# Altium footprint library Dr.Xiong_20160818.PcbLib: 266 footprints (part 16 of 17)
Each footprint in its own frame and in the unit in brackets; x right, y up, seen from the top. Pads: shape width x height; smd on the part's side, far side on the other; paste and mask are expansions set on the pad; w line width, h text height; cw(c..) or ccw(c..) is an arc to the next point about the centre after c.
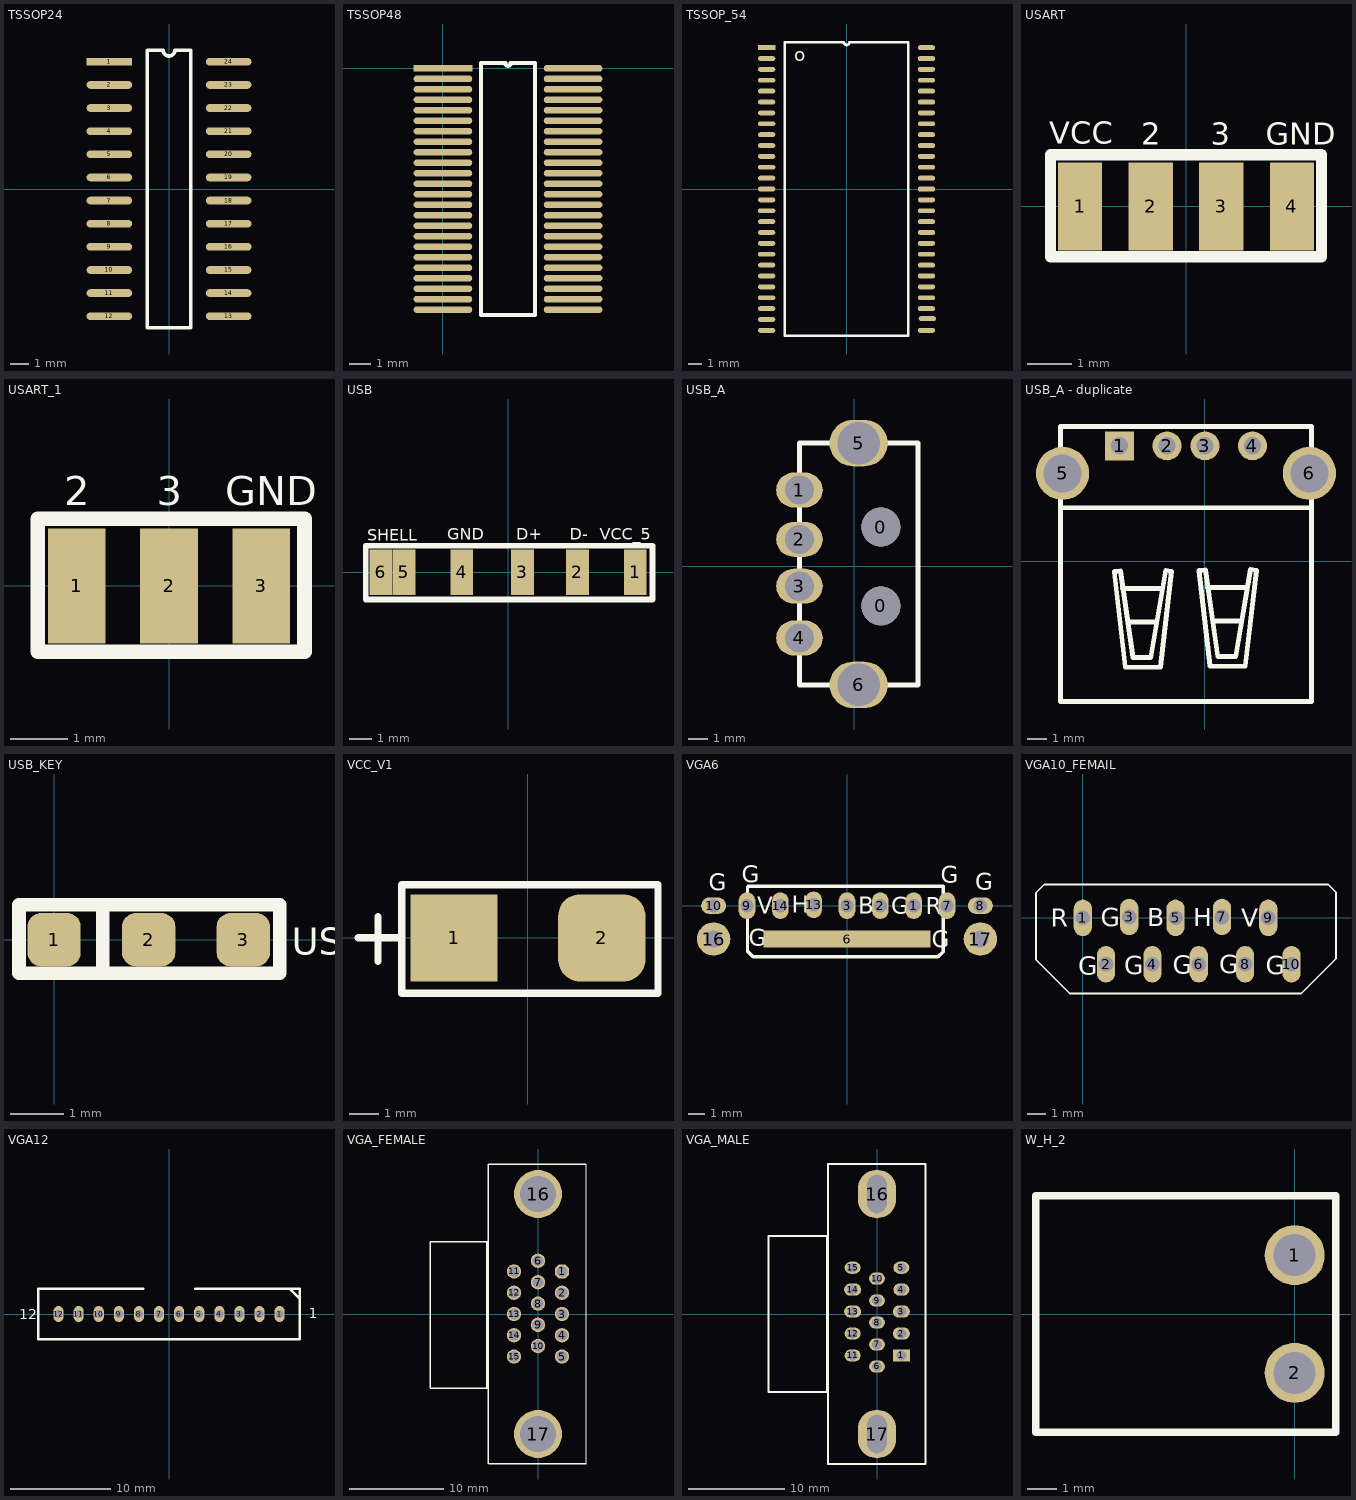
[diagram p15: the footprints below, top view; thin cyan lines are the x and y axes]

## TSSOP24 [mm]
pads (24):
  rect 2.5x0.43 smd: 1(-3.275,6.985)
  oval 2.5x0.43 smd: 2(-3.275,5.715) 3(-3.275,4.445) 4(-3.275,3.175) 5(-3.275,1.905) 6(-3.275,0.635) 7(-3.275,-0.635) 8(-3.275,-1.905) 9(-3.275,-3.175) 10(-3.275,-4.445) 11(-3.275,-5.715) 12(-3.275,-6.985) 13(3.275,-6.985) 14(3.275,-5.715) 15(3.275,-4.445) 16(3.275,-3.175) 17(3.275,-1.905) 18(3.275,-0.635) 19(3.275,0.635) 20(3.275,1.905) 21(3.275,3.175) 22(3.275,4.445) 23(3.275,5.715) 24(3.275,6.985)
Top Overlay:
  lines w0.2: -1.19,-7.62 1.19,-7.62 1.19,7.62 0.318,7.62 cw(c0,7.62) -0.318,7.62 -1.19,7.62 -1.19,-7.62

## TSSOP48 [mm]
pads (48):
  rect 2.794x0.32 smd: 1(0,0)
  oval 2.794x0.32 smd: 2(0,-0.5) 3(0,-1) 4(0,-1.5) 5(0,-2) 6(0,-2.5) 7(0,-3) 8(0,-3.5) 9(0,-4) 10(0,-4.5) 11(0,-5) 12(0,-5.5) 13(0,-6) 14(0,-6.5) 15(0,-7) 16(0,-7.5) 17(0,-8) 18(0,-8.5) 19(0,-9) 20(0,-9.5) 21(0,-10) 22(0,-10.5) 23(0,-11) 24(0,-11.5) 25(6.2,-11.5) 26(6.2,-11) 27(6.2,-10.5) 28(6.2,-10) 29(6.2,-9.5) 30(6.2,-9) 31(6.2,-8.5) 32(6.2,-8) 33(6.2,-7.5) 34(6.2,-7) 35(6.2,-6.5) 36(6.2,-6) 37(6.2,-5.5) 38(6.2,-5) 39(6.2,-4.5) 40(6.2,-4) 41(6.2,-3.5) 42(6.2,-3) 43(6.2,-2.5) 44(6.2,-2) 45(6.2,-1.5) 46(6.2,-1) 47(6.2,-0.5) 48(6.2,0)
Top Overlay:
  lines w0.2: 1.81,-11.75 1.81,0.25 2.975,0.25 ccw(c3.1,0.25) 3.225,0.25 4.39,0.25 4.39,-11.75 1.81,-11.75

## TSSOP_54 [mil]
pads (54):
  rect 50x14 smd: 1(-232.75,409.45)
  oval 50x14 smd: 2(-232.75,377.95) 3(-232.75,346.46) 4(-232.75,314.96) 5(-232.75,283.46) 6(-232.75,251.97) 7(-232.75,220.47) 8(-232.75,188.98) 9(-232.75,157.48) 10(-232.75,125.98) 11(-232.75,94.49) 12(-232.75,62.99) 13(-232.75,31.5) 14(-232.75,0) 15(-232.75,-31.5) 16(-232.75,-62.99) 17(-232.75,-94.49) 18(-232.75,-125.98) 19(-232.75,-157.48) 20(-232.75,-188.98) 21(-232.75,-220.47) 22(-232.75,-251.97) 23(-232.75,-283.46) 24(-232.75,-314.96) 25(-232.75,-346.46) 26(-232.75,-377.95) 27(-232.75,-409.45) 28(230.24,-409.45) 29(232.75,-375.44) 30(230.24,-346.46) 31(230.24,-314.96) 32(230.24,-283.46) 33(230.24,-251.97) 34(230.24,-220.47) 35(230.24,-188.98) 36(230.24,-157.48) 37(230.24,-125.98) 38(230.24,-94.49) 39(230.24,-62.99) 40(230.24,-31.5) 41(230.24,0) 42(230.24,31.5) 43(230.24,62.99) 44(230.24,94.49) 45(230.24,125.98) 46(230.24,157.48) 47(230.24,188.98) 48(230.24,220.47) 49(230.24,251.97) 50(230.24,283.46) 51(230.24,314.96) 52(230.24,346.46) 53(230.24,377.95) 54(230.24,409.45)
Top Overlay:
  lines w7.87: -180.19,-425.2 -180.19,425.2 -9.13,425.2 ccw(c-1.26,425.2) 6.62,425.2 177.68,425.2 177.68,-425.2 -180.19,-425.2
  text "o" at -152.75,369.45 h39.37

## USART [mm]
pads (4):
  rect 1x2 smd: 1(-2.4,0) 2(-0.8,0) 3(0.8,0) 4(2.4,0)
Top Overlay:
  lines w0.254: -3.073,-1.143 3.073,-1.143 3.073,1.168 -3.073,1.168 -3.073,-1.143
  text "GND" at 1.803,1.397 h0.51
  text "3" at 0.559,1.397 h0.51
  text "2" at -1.016,1.397 h0.51
  text "VCC" at -3.099,1.422 h0.51

## USART_1 [mm]
pads (3):
  rect 1x2 smd: 1(-1.6,0) 2(0,0) 3(1.6,0)
Top Overlay:
  lines w0.254: -2.273,-1.143 2.349,-1.143 2.349,1.168 -2.273,1.168 -2.273,-1.143
  text "GND" at 0.978,1.397 h0.51
  text "3" at -0.216,1.397 h0.51
  text "2" at -1.816,1.397 h0.51

## USB [mm]
pads (6):
  rect 1x2 smd: 1(5.588,0) 2(3.048,0) 3(0.635,0) 4(-2.032,0) 5(-4.572,0) 6(-5.588,0)
Top Overlay:
  lines w0.254: -6.248,-1.194 6.35,-1.194 6.35,1.168 -6.248,1.168 -6.248,-1.194
  text "D+" at 0.356,1.422 h0.51
  text "D-" at 2.718,1.422 h0.51
  text "VCC_5" at 4.039,1.422 h0.51
  text "GND" at -2.667,1.422 h0.51
  text "SHELL" at -6.172,1.397 h0.51

## USB_A [mm]
pads (8):
  round 2 hole 2: 0(1.372,-2.032) 0(1.372,2.032)
  oval 2.4x1.8 hole 1.5: 1(-2.819,3.937) 2(-2.819,1.397) 3(-2.819,-1.016) 4(-2.819,-3.683)
  oval 3x2.4 hole 2.2: 5(0.229,6.35) 6(0.229,-6.096)
Top Overlay:
  lines w0.254: -2.819,-6.096 3.277,-6.096 3.277,6.35 -2.819,6.35 -2.819,-6.096

## USB_A - duplicate [mil]
pads (6):
  rect 60x60 hole 36: 1(-176.77,239)
  round 60 hole 36: 2(-78.35,239) 3(0.39,239) 4(98.82,239)
  round 110.24 hole 78.74: 5(-294.88,181.91) 6(216.93,181.91)
Top Overlay:
  lines w10: -298.98,110.45 221.02,110.45 ; -170.98,-57 -88.98,-57 ; -157.98,-126 -100.98,-126 ; 5.02,-55 87.02,-55 ; 18.02,-124 75.02,-124 ; -298.98,-291 -298.98,279 221.02,279 221.02,-291 -298.98,-291 ; -187.88,-21.3 -164.98,-220 -91.98,-220 -68.98,-21 -80.98,-19 -111.98,-200 -148.98,-200 -174.78,-20.3 -187.88,-21.3 ; -11.88,-19.3 1.22,-18.3 27.02,-198 64.02,-198 95.02,-17 107.02,-19 84.02,-218 11.02,-218 -11.88,-19.3
Mechanical 15:
  lines w0.1: -2.48,-2 -0.48,0

## USB_KEY [mm]
pads (3):
  rrect50% 1x1 smd: 1(0,0) 2(1.778,0) 3(3.556,0)
Top Overlay:
  lines w0.254: -0.66,-0.635 2.311,-0.635 ; -0.66,-0.584 -0.66,0.66 2.337,0.66 4.242,0.66 4.242,-0.635 2.286,-0.635 ; 0.914,-0.559 0.914,0.635
  text "USB" at 4.47,-0.279 h0.51

## VCC_V1 [mm]
pads (2):
  rect 3x3 smd: 1(-2.54,0)
  rrect50% 3x3 smd: 2(2.54,0)
Top Overlay:
  lines w0.254: -5.842,0 -4.343,0 ; -5.156,-0.813 -5.156,0.737 ; -4.343,-1.905 -4.343,1.829 4.47,1.829 4.47,-1.905 -4.343,-1.905

## VGA6 [mm]
pads (12):
  oval 1x1.6 hole 0.8: 1(4,0) 2(2,0) 3(0,0) 7(6,0) 9(-6,0) 13(-2,0.051) 14(-4,0)
  rect 10x1 smd: 6(0,-2)
  oval 1.5x1 hole 0.8: 8(8,0) 10(-8,0)
  round 2 hole 1: 16(-8,-2) 17(8,-2)
Top Overlay:
  lines w0.203: -5.969,-2.743 -5.969,1.118 -5.918,1.168 5.766,1.168 5.766,-2.769 5.461,-3.073 -5.639,-3.073 -5.969,-2.743
  text "G" at -8.28,0.889 h1
  text "G" at 5.08,-2.515 h1
  text "V" at -5.385,-0.483 h1
  text "H" at -3.327,-0.432 h1
  text "B" at 0.66,-0.483 h1
  text "G" at 2.667,-0.508 h1
  text "R" at 4.724,-0.508 h1
  text "G" at -6.325,1.372 h1
  text "G" at 5.639,1.346 h1
  text "G" at 7.696,0.94 h1
  text "G" at -5.893,-2.438 h1

## VGA10_FEMAIL [mm]
pads (10):
  oval 1x2 hole 0.8: 1(0,0) 2(1.27,-2.54) 3(2.54,0.051) 4(3.81,-2.54) 5(5.08,0) 6(6.35,-2.54) 7(7.62,0.051) 8(8.89,-2.54) 9(10.16,0) 10(11.43,-2.54)
Top Overlay:
  lines w0.102: -1.981,1.829 13.437,1.829 13.868,1.397 13.868,-2.235 11.963,-4.14 -0.711,-4.14 -2.565,-2.286 -2.565,1.372 -2.108,1.829 -1.93,1.829
  text "G" at 2.261,-3.073 h1
  text "G" at 4.928,-3.048 h1
  text "G" at 7.468,-3.023 h1
  text "G" at 10.008,-3.073 h1
  text "G" at -0.254,-3.124 h1
  text "V" at 8.687,-0.483 h1
  text "H" at 6.045,-0.457 h1
  text "B" at 3.531,-0.457 h1
  text "G" at 0.991,-0.457 h1
  text "R" at -1.753,-0.483 h1

## VGA12 [mm]
pads (12):
  oval 1x1.6 hole 0.8: 1(11,0) 2(9,0) 3(7,0) 4(5,0) 5(3,0) 6(1,0) 7(-1,0) 8(-3,0) 9(-5,0) 10(-7,0) 11(-9,0) 12(-11,0)
Top Overlay:
  lines w0.254: -13,-2.5 13,-2.5 ; -13,-2.434 -13,2.5 -2.555,2.5 ; 2.602,2.5 13,2.5 13,-2.479 ; 11.887,2.5 11.978,2.5 ; 12.014,2.5 12.049,2.5 13,1.549
  text "12" at -14.935,-0.508 h1
  text "1" at 13.919,-0.432 h1
Bottom Overlay:
  text "G" at 11.303,-2.134 h1
  text "V" at 9.296,-2.134 h1
  text "H" at 7.341,-2.134 h1
  text "G" at 5.334,-2.134 h1
  text "r" at 3.226,-1.981 h1
  text "G" at 1.27,-2.134 h1
  text "g" at -0.711,-1.803 h1
  text "G" at -2.718,-2.134 h1
  text "b" at -4.775,-2.134 h1
  text "G" at -6.756,-2.184 h1

## VGA_FEMALE [mil]
pads (17):
  oct 60x60 hole 45: 1(100,177.16)
  round 60 hole 45: 2(100,88.58) 3(100,0) 4(100,-88.58) 5(100,-177.16) 6(0,222) 7(0,132.16) 8(0,43.58) 9(0,-45) 10(0,-133.58) 11(-100,177.16) 12(-100,88.58) 13(-100,0) 14(-100,-88.58) 15(-100,-177.16)
  round 200 hole 150: 16(0,500) 17(0,-500)
Top Overlay:
  lines w5: 200,-625 200,625
  lines w6: -449,-310 -207,-310 ; -449,-308 -450,-307 -450,302 -207,302 ; -213,-306 -213,301 ; -207,-624 -207,624 198,624 ; -206,-624 199,-624

## VGA_MALE [mil]
pads (17):
  rect 70x50 hole 40: 1(100,-170)
  oval 70x50 hole 40: 2(100,-80) 3(100,10) 13(-100,10) 14(-100,100)
  oval 65x50 hole 40: 4(100,100) 5(100,190) 6(0,-215) 7(0,-125) 8(0,-35) 9(0,55) 10(0,145) 11(-100,-170) 12(-100,-80) 15(-100,190)
  oval 157.48x200 hole 78.74 slot 157.48 at 90 deg: 16(0,492) 17(0,-492)
Top Overlay:
  lines w8: 127,-615 199,-615 199,615 130,615 -200,615 -200,-615 130,-615 ; -445,-320 -445,320 -205,320 -205,-320 -445,-320

## W_H_2 [mil]
pads (2):
  round 80 hole 56: 1(0,78.5) 2(0,-78.5)
Top Overlay:
  lines w10: -345,-157.48 -345,157.48 -16.02,157.48 55,157.48 55,-157.48 -345,-157.48